# Altium footprint library iMX6 TinyRex Baseboard Lite_V1I1_PCB.PcbLib: 58 footprints (part 1 of 4)
Each footprint in its own frame and in the unit in brackets; x right, y up, seen from the top. Pads: shape width x height; smd on the part's side, far side on the other; paste and mask are expansions set on the pad; w line width, h text height; cw(c..) or ccw(c..) is an arc to the next point about the centre after c.
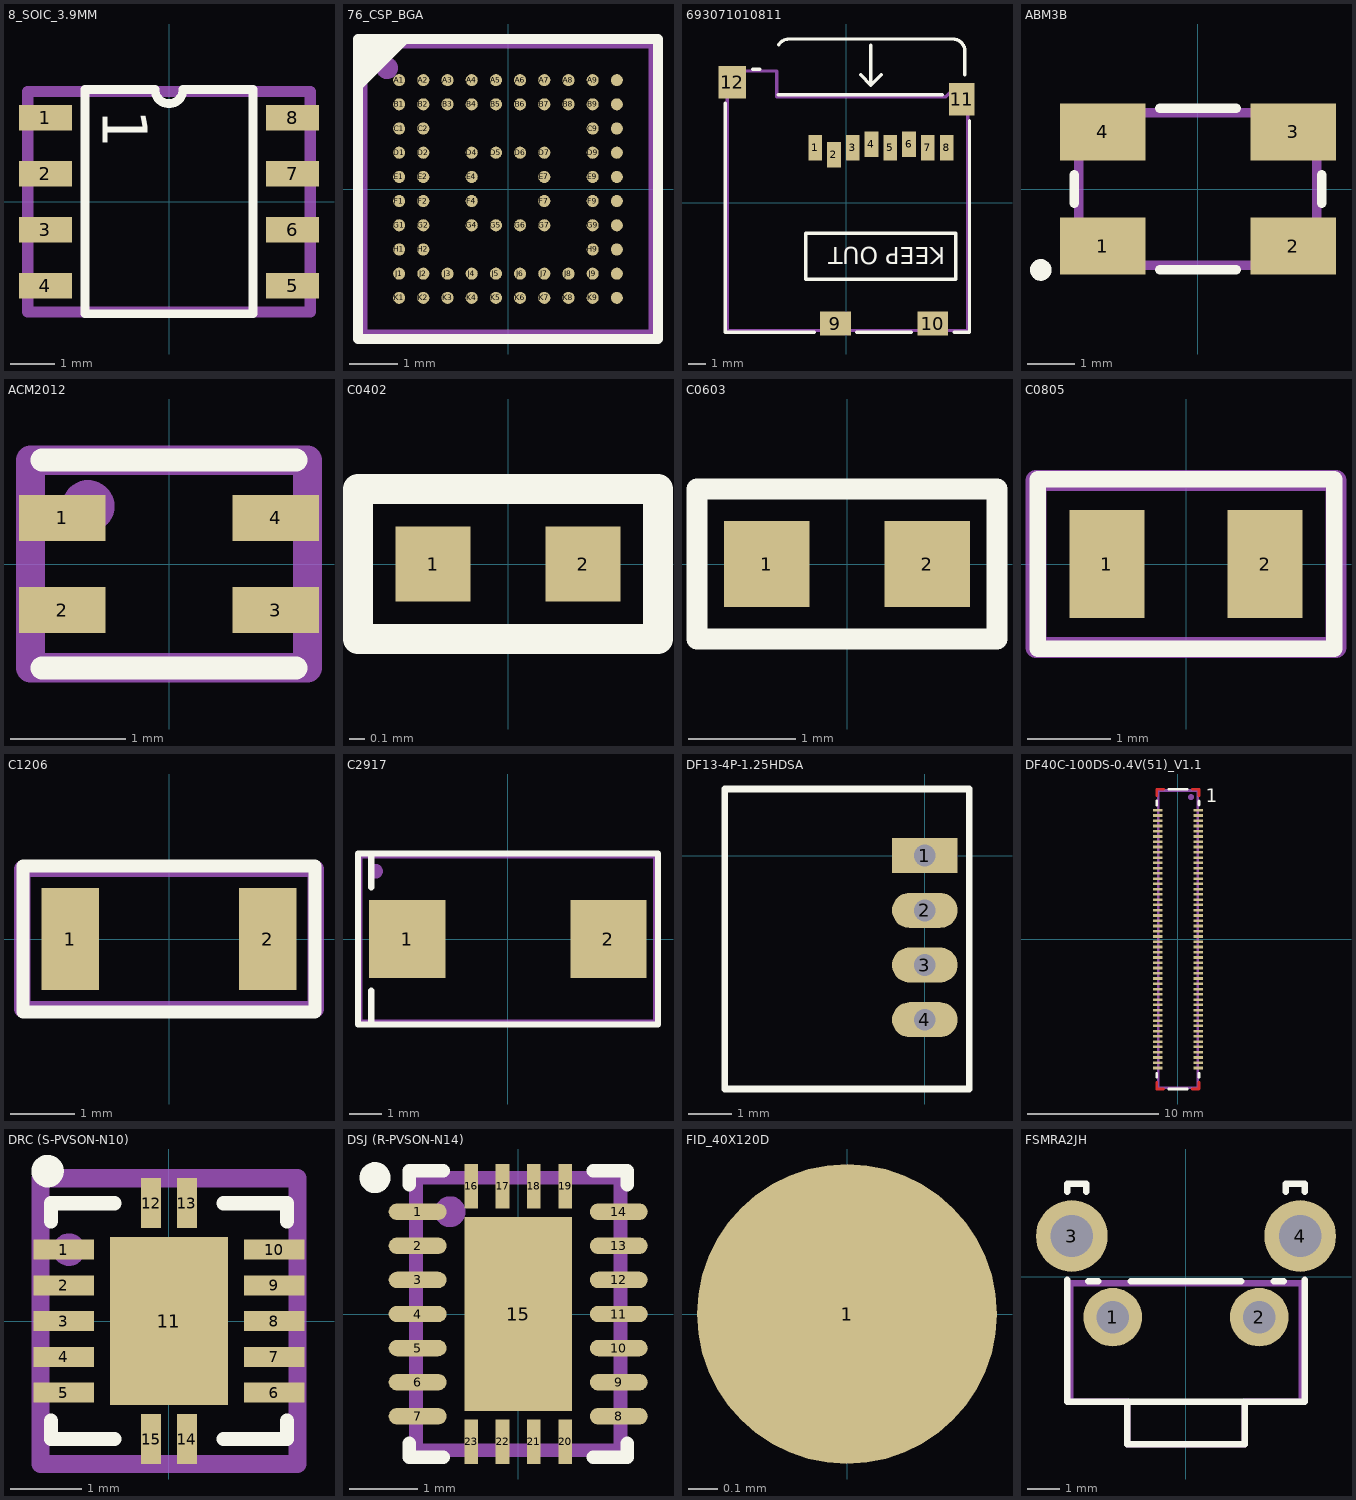
[diagram p0: the footprints below, top view; thin cyan lines are the x and y axes]

## 8_SOIC_3.9MM [mm]
pads (8):
  rect 1.2x0.58 smd: 1(-2.8,1.905) 2(-2.8,0.635) 3(-2.8,-0.635) 4(-2.8,-1.905) 5(2.8,-1.905) 6(2.8,-0.635) 7(2.8,0.635) 8(2.8,1.905)
Top Overlay:
  lines w0.2: -1.905,-2.54 -1.905,2.54 -0.318,2.54 ccw(c0,2.54) 0.318,2.54 1.905,2.54 1.905,-2.54 -1.905,-2.54
  text "1" at -1.5,2.1 h1.02
Mechanical 16:
  circle w0.254: c-2.7,1.9 r0.1
  lines w0.254: -3.2,-2.5 3.2,-2.5 3.2,2.5 -3.2,2.5 -3.2,-2.5
Mechanical 29:
  text ".Designator" at 0.8,-1 h1.52
3D body "SOIC-8-1.step": height 1.75, standoff 0, extent -3,-2.45 3,2.45

## 76_CSP_BGA [mm] "Creator MM"
pads (76):
  round 0.25 smd mask+0.05: A1(-2.25,2.25) A2(-1.75,2.25) A3(-1.25,2.25) A4(-0.75,2.25) A5(-0.25,2.25) A6(0.25,2.25) A7(0.75,2.25) A8(1.25,2.25) A9(1.75,2.25) A10(2.25,2.25) B1(-2.25,1.75) B2(-1.75,1.75) B3(-1.25,1.75) B4(-0.75,1.75) B5(-0.25,1.75) B6(0.25,1.75) B7(0.75,1.75) B8(1.25,1.75) B9(1.75,1.75) B10(2.25,1.75) C1(-2.25,1.25) C2(-1.75,1.25) C9(1.75,1.25) C10(2.25,1.25) D1(-2.25,0.75) D2(-1.75,0.75) D4(-0.75,0.75) D5(-0.25,0.75) D6(0.25,0.75) D7(0.75,0.75) D9(1.75,0.75) D10(2.25,0.75) E1(-2.25,0.25) E2(-1.75,0.25) E4(-0.75,0.25) E7(0.75,0.25) E9(1.75,0.25) E10(2.25,0.25) F1(-2.25,-0.25) F2(-1.75,-0.25) F4(-0.75,-0.25) F7(0.75,-0.25) F9(1.75,-0.25) F10(2.25,-0.25) G1(-2.25,-0.75) G2(-1.75,-0.75) G4(-0.75,-0.75) G5(-0.25,-0.75) G6(0.25,-0.75) G7(0.75,-0.75) G9(1.75,-0.75) G10(2.25,-0.75) H1(-2.25,-1.25) H2(-1.75,-1.25) H9(1.75,-1.25) H10(2.25,-1.25) J1(-2.25,-1.75) J2(-1.75,-1.75) J3(-1.25,-1.75) J4(-0.75,-1.75) J5(-0.25,-1.75) J6(0.25,-1.75) J7(0.75,-1.75) J8(1.25,-1.75) J9(1.75,-1.75) J10(2.25,-1.75) K1(-2.25,-2.25) K2(-1.75,-2.25) K3(-1.25,-2.25) K4(-0.75,-2.25) K5(-0.25,-2.25) K6(0.25,-2.25) K7(0.75,-2.25) K8(1.25,-2.25) K9(1.75,-2.25) K10(2.25,-2.25)
Top Overlay:
  region: -3.1,3.1 -2,3.1 -3.1,2
  lines w0.2: -3.1,-3.1 3.1,-3.1 3.1,3.1 -3.1,3.1 -3.1,-3.1
Mechanical 16:
  circle w0.254: c-2.5,2.5 r0.1
  lines w0.2: -3,-3 3,-3 3,3 -3,3 -3,-3
Mechanical 29:
  text ".Designator" at -0.9,-0.7 h1.52
3D body: height 0.8, standoff 0.15, extent -3.1,-3.1 3.1,3.1

## 693071010811 [mm]
pads (12):
  rect 0.8x1.5 smd mask+0.09: 1(-1.815,3.225) 2(-0.715,2.825) 3(0.385,3.225) 4(1.485,3.425) 5(2.585,3.225) 6(3.685,3.425) 7(4.785,3.225) 8(5.885,3.225)
  rect 1.8x1.4 smd: 9(-0.625,-7.075) 10(5.075,-7.075)
  rect 1.5x1.9 smd: 11(6.775,6.075)
  rect 1.6x1.9 smd: 12(-6.675,7.075)
Top Overlay:
  lines w0.2: -7.075,5.825 -7.075,-7.575 -1.875,-7.575 ; -5.475,7.825 -5.05,7.825 ; -3.975,6.325 5.625,6.325 ; -3.956,9.25 cw(c-3.35,8.9) -3.35,9.6 6.25,9.6 cw(c6.25,8.9) 6.95,8.9 6.95,7.5 ; 0.625,-7.575 3.825,-7.575 ; 0.85,7.5 1.45,6.9 ; 1.45,9.25 1.45,6.9 ; 2.05,7.5 1.45,6.9 ; 6.325,-7.575 7.225,-7.575 7.225,4.825 ; -2.375,-4.475 -2.375,-1.775 6.425,-1.775 6.425,-4.475 -2.375,-4.475
  text "KEEP OUT" at 5.8,-2.6 h1
Mechanical 16:
  lines w0.2: -6.975,-7.475 7.125,-7.475 7.125,6.725 6.325,6.725 5.825,6.225 -4.075,6.225 -4.075,7.725 -6.975,7.725 -6.975,-7.475
Mechanical 29:
  text ".Designator" at 1.8,-4 h3
3D body "693071010811.stp": height 1.83, standoff -0.07, extent -6.875,-7.46 7.125,7.75

## ABM3B [mm] "Creator MM"
pads (4):
  rect 1.8x1.2 smd: 1(-2,-1.2) 2(2,-1.2) 3(2,1.2) 4(-2,1.2)
Top Overlay:
  circle w0.254: c-3.3,-1.7 r0.1
  lines w0.2: -2.6,-0.3 -2.6,0.3 ; -0.8,-1.7 0.8,-1.7 ; -0.8,1.7 0.8,1.7 ; 2.6,-0.3 2.6,0.3
Mechanical 16:
  circle w0.254: c-2,-1.1 r0.1
  lines w0.2: -2.5,-1.6 -2.5,1.6 2.5,1.6 2.5,-1.6 -2.5,-1.6
Mechanical 29:
  text ".Designator" at -0.8,-0.6 h1.2
3D body: height 1.12, standoff 1, extent -2,-1.2 2,1.2
3D body "ABM3B.STEP": height 1.12, standoff 0.02, extent -2.5,-1.6 2.5,1.6

## ACM2012 [mm]
pads (4):
  rect 0.75x0.4 smd mask+0.076: 1(-0.925,0.4) 2(-0.925,-0.4) 3(0.925,-0.4) 4(0.925,0.4)
Top Overlay:
  lines w0.2: -1.1,-0.9 1.1,-0.9 ; -1.1,0.9 1.1,0.9
Mechanical 16:
  circle w0.254: c-0.7,0.5 r0.1
  lines w0.254: -1.2,-0.9 -1.2,0.9 1.2,0.9 1.2,-0.9 -1.2,-0.9
Mechanical 29:
  text ".Designator" at -0.3,-0.3 h0.4
3D body: height 1.3, standoff 0, extent -1.2,-0.7 1.2,0.7

## C0402 [mm]
pads (2):
  rect 0.5x0.5 smd: 1(-0.5,0) 2(0.5,0)
Top Overlay:
  lines w0.2: -1,-0.5 1,-0.5 1,0.5 -1,0.5 -1,-0.5
Mechanical 16:
  lines w0.15: -1,-0.5 1,-0.5 1,0.5 -1,0.5 -1,-0.5
Mechanical 29:
  text ".Designator" at -0.7,-0.2 h0.4
3D body "CAPC1005X56N EIA 0402.step": height 0.56, standoff 0, extent -0.5,-0.25 0.5,0.25

## C0603 [mm]
pads (2):
  rect 0.8x0.8 smd: 1(-0.75,0) 2(0.75,0)
Top Overlay:
  lines w0.2: -1.4,-0.7 1.4,-0.7 1.4,0.7 -1.4,0.7 -1.4,-0.7
Mechanical 16:
  lines w0.15: -1.4,-0.7 -1.4,0.7 1.4,0.7 1.4,-0.7 -1.4,-0.7
Mechanical 29:
  text ".Designator" at 1,0.3 h0.6
3D body "C0603.step": height 0.95, standoff 0.15, extent -0.8,-0.425 0.8,0.435
3D body "C0603.step": height 0.79, standoff 0, extent -0.8,-0.425 0.8,0.435

## C0805 [mm]
pads (2):
  rect 0.9x1.3 smd: 1(-0.95,0) 2(0.95,0)
Top Overlay:
  lines w0.2: -1.778,-1.016 1.778,-1.016 1.778,1.016 -1.778,1.016 -1.778,-1.016
Mechanical 16:
  lines w0.254: -1.8,-1 1.8,-1 1.8,1 -1.8,1 -1.8,-1
Mechanical 29:
  text ".Designator" at -1,-0.3 h0.6
3D body "CAPC2012X95N EIA 0805.step": height 0.95, standoff 0, extent -1,-0.6 1,0.6
3D body "CAPC2012X95N EIA 0805.step": height 1.5, standoff 0.55, extent -1,-0.6 1,0.6

## C1206 [mm]
pads (2):
  rect 0.9x1.6 smd: 1(-1.55,0) 2(1.55,0)
Top Overlay:
  lines w0.2: -2.286,-1.143 -2.286,1.143 2.286,1.143 2.286,-1.143 -2.286,-1.143
Mechanical 16:
  lines w0.254: -2.3,-1.1 2.3,-1.1 2.3,1.1 -2.3,1.1 -2.3,-1.1
Mechanical 29:
  text ".Designator" at 1.7,0.5 h1
3D body "CAPC3216X95N EIA 1206.step": height 0.95, standoff 0, extent -1.6,-0.8 1.6,0.8
3D body "CAPC3216X95N EIA 1206.step": height 1.8, standoff 0.85, extent -1.6,-0.8 1.6,0.8

## C2917 [mm] "Creator MM. Footprint density lvl B"
height 3.1
pads (2):
  rect 2.37x2.43 smd: 1(-3.12,0) 2(3.12,0)
Top Overlay:
  lines w0.2: -4.24,-2.65 -4.24,-1.6 ; -4.24,1.6 -4.24,2.65 ; -4.645,-2.65 -4.645,2.65 4.655,2.65 4.655,-2.65 -4.645,-2.65
Mechanical 16:
  circle w0.254: c-4.1,2.1 r0.1
  lines w0.2: -4.6,-2.6 4.6,-2.6 4.6,2.6 -4.6,2.6 -4.6,-2.6
Mechanical 29:
  text ".Designator" at 2.9,0.8 h1.52
3D body "CAP_TANT_7343-31.step": height 3.1, standoff 0, extent -3.795,-2.3 3.805,2.3

## DF13-4P-1.25HDSA [mm] "HIROSE DF13 4P Thruhole Horizontal"
pads (4):
  rect 1.5x0.8 hole 0.5: 1(0,0)
  oval 1.5x0.8 hole 0.5: 2(0,-1.25) 3(0,-2.5) 4(0,-3.75)
Top Overlay:
  lines w0.15: -4.572,-5.334 1.016,-5.334 1.016,1.524 -4.572,1.524 -4.572,-5.334
3D body "DF13-4P-1.25DS.stp": height 3.61, standoff -2.29, extent -4.478,-5.207 0.922,1.443

## DF40C-100DS-0.4V(51)_V1.1 [mm] "Creator MM. Update: Replaced part of silkcreen by copper"
pads (100):
  rect 0.7x0.2 smd mask+0.03: 1(1.54,9.8) 2(-1.54,9.8) 3(1.54,9.4) 4(-1.54,9.4) 5(1.54,9) 6(-1.54,9) 7(1.54,8.6) 8(-1.54,8.6) 9(1.54,8.2) 10(-1.54,8.2) 11(1.54,7.8) 12(-1.54,7.8) 13(1.54,7.4) 14(-1.54,7.4) 15(1.54,7) 16(-1.54,7) 17(1.54,6.6) 18(-1.54,6.6) 19(1.54,6.2) 20(-1.54,6.2) 21(1.54,5.8) 22(-1.54,5.8) 23(1.54,5.4) 24(-1.54,5.4) 25(1.54,5) 26(-1.54,5) 27(1.54,4.6) 28(-1.54,4.6) 29(1.54,4.2) 30(-1.54,4.2) 31(1.54,3.8) 32(-1.54,3.8) 33(1.54,3.4) 34(-1.54,3.4) 35(1.54,3) 36(-1.54,3) 37(1.54,2.6) 38(-1.54,2.6) 39(1.54,2.2) 40(-1.54,2.2) 41(1.54,1.8) 42(-1.54,1.8) 43(1.54,1.4) 44(-1.54,1.4) 45(1.54,1) 46(-1.54,1) 47(1.54,0.6) 48(-1.54,0.6) 49(1.54,0.2) 50(-1.54,0.2) 51(1.54,-0.2) 52(-1.54,-0.2) 53(1.54,-0.6) 54(-1.54,-0.6) 55(1.54,-1) 56(-1.54,-1) 57(1.54,-1.4) 58(-1.54,-1.4) 59(1.54,-1.8) 60(-1.54,-1.8) 61(1.54,-2.2) 62(-1.54,-2.2) 63(1.54,-2.6) 64(-1.54,-2.6) 65(1.54,-3) 66(-1.54,-3) 67(1.54,-3.4) 68(-1.54,-3.4) 69(1.54,-3.8) 70(-1.54,-3.8) 71(1.54,-4.2) 72(-1.54,-4.2) 73(1.54,-4.6) 74(-1.54,-4.6) 75(1.54,-5) 76(-1.54,-5) 77(1.54,-5.4) 78(-1.54,-5.4) 79(1.54,-5.8) 80(-1.54,-5.8) 81(1.54,-6.2) 82(-1.54,-6.2) 83(1.54,-6.6) 84(-1.54,-6.6) 85(1.54,-7) 86(-1.54,-7) 87(1.54,-7.4) 88(-1.54,-7.4) 89(1.54,-7.8) 90(-1.54,-7.8) 91(1.54,-8.2) 92(-1.54,-8.2) 93(1.54,-8.6) 94(-1.54,-8.6) 95(1.54,-9) 96(-1.54,-9) 97(1.54,-9.4) 98(-1.54,-9.4) 99(1.54,-9.8) 100(-1.54,-9.8)
Top Layer:
  lines w0.2: -1.6,-10.9 -1.6,-11.4 -1.1,-11.4 ; -1.6,10.9 -1.6,11.4 -1.1,11.4 ; 1.1,-11.4 1.6,-11.4 1.6,-10.9 ; 1.1,11.4 1.6,11.4 1.6,10.9
Top Overlay:
  lines w0.2: -1.6,-10.5 -1.6,-10.2 ; -1.6,10.2 -1.6,10.5 ; -0.7,-11.4 0.7,-11.4 ; -0.7,11.4 0.7,11.4 ; 1.6,-10.5 1.6,-10.2 ; 1.6,10.2 1.6,10.5
  text "1" at 2.1,10.4 h1.02
Top Solder:
  lines w0.4: -1.6,-10.9 -1.6,-11.4 -1.1,-11.4 ; -1.6,10.9 -1.6,11.4 -1.1,11.4 ; 1.1,-11.4 1.6,-11.4 1.6,-10.9 ; 1.1,11.4 1.6,11.4 1.6,10.9
Mechanical 16:
  circle w0.254: c1,10.8 r0.1
  lines w0.2: -1.5,-11.3 1.5,-11.3 ; -1.5,-11.3 -1.5,11.3 1.5,11.3 1.5,-11.3 ; -1.5,-11.3 1.5,-11.3
Mechanical 29:
  text ".Designator" at 0.6,-1.6 h1.2
3D body "DF40C-100DS.stp": height 1.45, standoff 0, extent -1.69,-11.3 1.69,11.3

## DRC (S-PVSON-N10) [mm] "Creator MM"
pads (15):
  rect 0.85x0.28 smd mask+0.025: 1(-1.475,1) 2(-1.475,0.5) 3(-1.475,0) 4(-1.475,-0.5) 5(-1.475,-1) 6(1.475,-1) 7(1.475,-0.5) 8(1.475,0) 9(1.475,0.5) 10(1.475,1)
  rect 1.65x2.35 smd paste-1.524 mask+0.025: 11(0,0)
  rect 0.28x0.7 smd mask+0.11: 12(-0.25,1.651) 13(0.25,1.651) 14(0.25,-1.651) 15(-0.25,-1.651)
Top Overlay:
  circle w0.254: c-1.7,2.1 r0.1
  lines w0.2: -1.651,-1.397 -1.651,-1.651 -0.762,-1.651 ; -1.651,1.397 -1.651,1.651 -0.762,1.651 ; 0.762,-1.651 1.651,-1.651 1.651,-1.397 ; 0.762,1.651 1.651,1.651 1.651,1.397
Top Paste:
  rectangle: 0.102,0.102 0.762,1.143
  rectangle: 0.102,-1.143 0.762,-0.102
  rectangle: -0.762,-1.143 -0.102,-0.102
  rectangle: -0.762,0.102 -0.102,1.143
Mechanical 16:
  circle w0.254: c-1.4,1 r0.1
  lines w0.254: -1.8,-2 -1.8,2 1.8,2 1.8,-2 -1.8,-2
Mechanical 29:
  text ".Designator" at 1,0.6 h1
3D body: height 1, standoff 0, extent -1.651,-1.651 1.651,1.651

## DSJ (R-PVSON-N14) [mm] "Creator MM"
pads (23):
  oval 0.85x0.24 smd mask+0.07: 1(-1.475,1.5) 2(-1.475,1) 3(-1.475,0.5) 4(-1.475,0) 5(-1.475,-0.5) 6(-1.475,-1) 7(-1.475,-1.5) 8(1.475,-1.5) 9(1.475,-1) 10(1.475,-0.5) 11(1.475,0) 12(1.475,0.5) 13(1.475,1) 14(1.475,1.5)
  rect 1.58x2.85 smd paste-10 mask+0.07: 15(0,0)
  rect 0.2x0.65 smd mask+0.07: 16(-0.69,1.875) 17(-0.23,1.875) 18(0.23,1.875) 19(0.69,1.875) 20(0.69,-1.875) 21(0.23,-1.875) 22(-0.23,-1.875) 23(-0.69,-1.875)
Top Overlay:
  circle w0.254: c-2.1,2 r0.1
  lines w0.2: -1.6,-1.9 -1.6,-2.1 -1.1,-2.1 ; -1.6,1.9 -1.6,2.1 -1.1,2.1 ; 1.1,-2.1 1.6,-2.1 1.6,-1.9 ; 1.1,2.1 1.6,2.1 1.6,1.9
Top Paste:
  region: -0.778,-0.1 -0.778,-1.4 -0.1,-1.4 -0.1,-0.1
  region: 0.122,-0.1 0.122,-1.4 0.8,-1.4 0.8,-0.1
  region: -0.778,1.4 -0.778,0.1 -0.1,0.1 -0.1,1.4
  region: 0.122,1.4 0.122,0.1 0.8,0.1 0.8,1.4
Mechanical 16:
  circle w0.254: c-1,1.5 r0.1
  lines w0.2: -1.5,-2 1.5,-2 1.5,2 -1.5,2 -1.5,-2
Mechanical 29:
  text ".Designator" at 0.5,-1.3 h1
3D body "VSON-14.step": height 1.04, standoff -0.01, extent -1.605,-2.105 1.605,2.105

## FID_40X120D [mil]
pads (1):
  round 40 smd paste-40 mask+40: 1(0,0)

## FSMRA2JH [mm] "Creator MM"
height 7.01
pads (4):
  round 1.8 hole 1: 1(-2.25,-1.245) 2(2.25,-1.245)
  round 2.2 hole 1.3: 3(-3.505,1.245) 4(3.505,1.245)
Top Overlay:
  lines w0.2: -3.65,-0.1 -3.65,-3.845 3.65,-3.845 3.65,-0.1 ; -3.65,2.6 -3.65,2.85 -3.055,2.85 -3.055,2.6 ; -3,-0.145 -2.7,-0.145 ; -1.8,-3.845 -1.8,-5.145 1.8,-5.145 1.8,-3.845 ; -1.7,-0.145 1.7,-0.145 ; 2.7,-0.145 3,-0.145 ; 3.055,2.6 3.055,2.85 3.65,2.85 3.65,2.6
Mechanical 16:
  lines w0.2: -3.55,-3.845 -1.8,-3.845 -1.8,-5.145 1.8,-5.145 1.8,-3.845 3.55,-3.845 3.55,-0.2 -3.55,-0.2 -3.55,-3.845
Mechanical 29:
  text ".Designator" at 1.4,-1.5 h1.2
3D body "c-1825027-5-g1-3d.stp": height 7.05, standoff -3.47, extent -4.204,-5.094 4.204,2.767